# Altium footprint library IntLib.PcbLib: 221 footprints (part 5 of 14)
Each footprint in its own frame and in the unit in brackets; x right, y up, seen from the top. Pads: shape width x height; smd on the part's side, far side on the other; paste and mask are expansions set on the pad; w line width, h text height; cw(c..) or ccw(c..) is an arc to the next point about the centre after c.
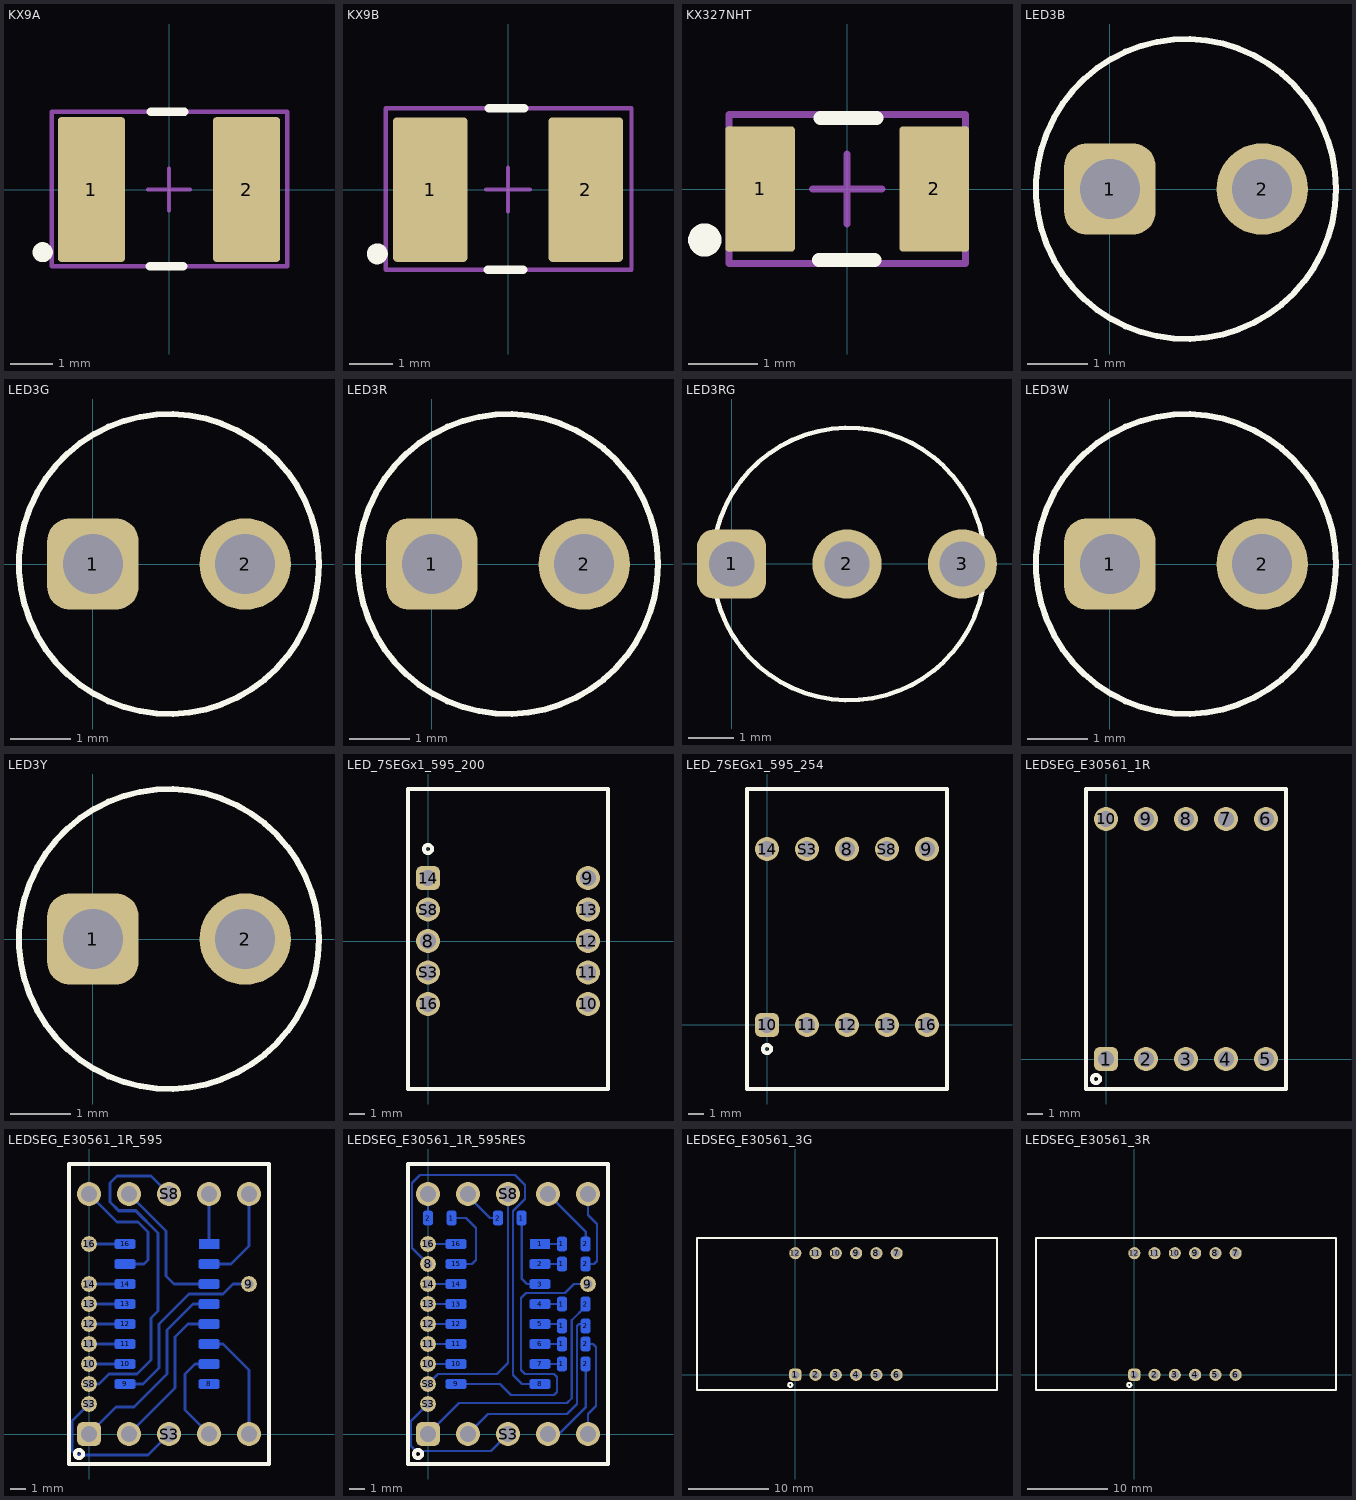
[diagram p4: the footprints below, top view; thin cyan lines are the x and y axes]

## KX9A [mm] "KX Quartz"
height 1.5
pads (2):
  rrect10% 1.6x3.45 smd: 1(-1.85,0) 2(1.85,0)
Top Overlay:
  circle w0.254: c-3.009,-1.493 r0.112
  lines w0.2: -0.457,-1.829 0.343,-1.829 ; -0.432,1.854 0.368,1.854
Mechanical 13:
  lines w0.1: -2.794,-1.829 2.819,-1.829 2.819,1.854 -2.794,1.854 -2.794,-1.829
Mechanical 15:
  lines w0.1: -0.5,0 0.5,0 ; 0,-0.5 0,0.5
3D body: height 1.12, standoff 0, extent -2.556,-1.61 2.454,1.6

## KX9B [mm] "KX Quartz"
height 1.5
pads (2):
  rrect10% 1.7x3.3 smd: 1(-1.775,0) 2(1.775,0)
Top Overlay:
  circle w0.254: c-2.984,-1.468 r0.112
  lines w0.2: -0.457,-1.829 0.343,-1.829 ; -0.432,1.854 0.368,1.854
Mechanical 13:
  lines w0.1: -2.794,-1.829 -2.794,1.854 2.819,1.854 2.819,-1.829 -2.794,-1.829
Mechanical 15:
  lines w0.1: -0.5,0 0.5,0 ; 0,-0.5 0,0.5
3D body: height 1.12, standoff 0, extent -2.556,-1.61 2.454,1.6

## KX327NHT [mm] "KX Quartz"
height 1.5
pads (2):
  rrect10% 1x1.8 smd: 1(-1.25,0) 2(1.25,0)
Top Overlay:
  circle w0.254: c-2.044,-0.731 r0.112
  lines w0.2: -0.406,-1.016 0.394,-1.016 ; -0.381,1.016 0.419,1.016
Mechanical 13:
  lines w0.1: -1.7,-1.067 1.7,-1.067 1.7,1.067 -1.7,1.067 -1.7,-1.067
Mechanical 15:
  lines w0.1: -0.5,0 0.5,0 ; 0,-0.5 0,0.5
3D body: height 0.71, standoff 0, extent -1.6,-0.686 1.6,0.814

## LED3B [mil]
pads (2):
  rrect50% 60x60 hole 39.37: 1(0,0)
  round 60 hole 39.37: 2(100,0)
Top Overlay:
  circle w3.94: c50,0 r98.43
3D body: height 235.24, standoff -59.06, extent -14.51,-65.9 112,63.9

## LED3G [mil]
pads (2):
  rrect50% 60x60 hole 39.37: 1(0,0)
  round 60 hole 39.37: 2(100,0)
Top Overlay:
  circle w3.94: c50,0 r98.43
3D body: height 244.09, standoff -78.74, extent -26.16,-78.46 111,78.46

## LED3R [mil]
pads (2):
  rrect50% 60x60 hole 39.37: 1(0,0)
  round 60 hole 39.37: 2(100,0)
Top Overlay:
  circle w3.94: c50,0 r98.43
3D body: height 244.09, standoff -78.74, extent -29,-78.46 108.16,78.46

## LED3RG [mil]
pads (3):
  rrect50% 60x60 hole 39.37: 1(0,0)
  round 60 hole 39.37: 2(100,0) 3(200,0)
Top Overlay:
  circle w3.94: c101.57,0 r118.11
3D body: height 279.74, standoff -118.06, extent -16.78,-77.48 216.78,80

## LED3W [mil]
pads (2):
  rrect50% 60x60 hole 39.37: 1(0,0)
  round 60 hole 39.37: 2(100,0)
Top Overlay:
  circle w3.94: c50,0 r98.43
3D body: height 259.84, standoff -98.43, extent -25.8,-79.73 112,77.73

## LED3Y [mil]
pads (2):
  rrect50% 60x60 hole 39.37: 1(0,0)
  round 60 hole 39.37: 2(100,0)
Top Overlay:
  circle w3.94: c50,0 r98.43
3D body: height 244.09, standoff -78.74, extent -27.58,-79 109.58,77.92

## LED_7SEGx1_595_200 [mil] "LED_7SEGx1_595_200"
height 551.18
pads (10):
  round 60 hole 39.37: 8(0,0) 9(400,157.48) 10(400,-157.48) 11(400,-78.74) 12(400,0) 13(400,78.74) 16(0,-157.48) S3(0,-78.74) S8(0,78.74)
  rrect50% 60x60 hole 39.37: 14(0,157.48)
Top Overlay:
  circle w10: c0,230 r10
  lines w10: -50,-370 450,-370 450,380 -50,380 -50,-370
3D body: height 610.74, standoff 47.74, extent -48.03,-370 448.03,378.03
3D body: height 236.22, standoff -110.24, extent -38.74,-196.85 40,196.85
3D body: height 236.22, standoff -110.24, extent 361.26,-196.85 440,196.85

## LED_7SEGx1_595_254 [mil] "LED_7SEGx1_595_254"
height 551.18
pads (10):
  round 60 hole 39.37: 8(200,440) 9(400,440) 11(100,0) 12(200,0) 13(300,0) 14(0,440) 16(400,0) S3(100,440) S8(300,440)
  rrect50% 60x60 hole 39.37: 10(0,0)
Top Overlay:
  circle w10: c0,-60 r10
  lines w10: -50,-160 -50,590 450,590 450,-160 -50,-160
3D body: height 345.28, standoff -109.06, extent -50,-50 450,50
3D body: height 345.28, standoff -109.06, extent -50,390 450,490
3D body: height 787.9, standoff 96.26, extent -59.84,-158.03 459.84,590

## LEDSEG_E30561_1R [mil] "LED 7-SEG 3-DIGIT"
height 551.18
pads (10):
  rrect50% 60x60 hole 39.37: 1(0,0)
  round 60 hole 39.37: 2(100,0) 3(200,0) 4(300,0) 5(400,0) 6(400,600) 7(300,600) 8(200,600) 9(100,600) 10(0,600)
Top Overlay:
  circle w10: c-25,-50 r10
  lines w10: -50,-75 450,-75 450,675 -50,675 -50,-75
3D body: height 314.96, standoff -248.03, extent -48.03,-75 448.03,673.03

## LEDSEG_E30561_1R_595 [mil] "LED 7-SEG 3-DIGIT + 595"
height 551.18
pads (35):
  rrect50% 52x24 smd far side mask+4: 8(300,125) 9(90,125) 10(90,175) 11(90,225) 12(90,275) 13(90,325) 14(90,375) 16(90,475) ""(90,425) ""(300,175) ""(300,225) ""(300,275) ""(300,375) ""(300,425) ""(300,325)
  round 39.37 hole 23.62: 9(400,375) 10(0,175) 11(0,225) 12(0,275) 13(0,325) 14(0,375) 16(0,475) S3(0,75) S8(0,125)
  round 60 hole 39.37: S3(200,0) S8(200,600) ""(0,600) ""(100,0) ""(100,600) ""(300,0) ""(300,600) ""(400,0) ""(400,600)
  rrect50% 60x60 hole 39.37: ""(0,0)
  rect 50x24 smd far side mask+4: ""(300,475)
Bottom Layer:
  lines w7.87: 0,0 67.5,67.5 112.5,67.5 195,150 195,260 260,325 300,325 ; 0,75 -42.5,32.5 -42.5,-42.5 -32.5,-52.5 147.5,-52.5 200,0 ; 0,125 25,125 50,150 120,150 155,185 155,290 172.5,307.5 172.5,502.5 116.81,558.19 74.31,558.19 52.5,580 52.5,627.5 70,645 155,645 200,600 ; 0,175 90,175 ; 0,225 90,225 ; 0,275 90,275 ; 0,325 90,325 ; 0,375 90,375 ; 0,475 90,475 ; 0,600 70,530 122.5,530 147.5,505 147.5,435 137.5,425 90,425 ; 90,125 135,125 175,165 175,275 250,350 335,350 360,375 400,375 ; 100,0 215,115 215,242.5 247.5,275 300,275 ; 100,600 192.5,507.5 192.5,395 212.5,375 300,375 ; 300,0 240,60 240,150 265,175 300,175 ; 300,225 335,225 400,160 400,0 ; 300,425 355,425 400,470 400,600 ; 300,475 300,600 ; 300,600 300,600
Top Overlay:
  circle w10: c-25,-50 r10
  lines w10: -50,-75 450,-75 450,675 -50,675 -50,-75
Bottom Overlay:
  lines w8: 125,105 125,495 245,495 265,475 265,105 125,105
3D body: height 314.96, standoff -248.03, extent -48.03,-75 448.03,673.03
3D body: height 67, standoff 0, extent 73,105 317,495

## LEDSEG_E30561_1R_595RES [mil] "LED 7-SEG 3-DIGIT + 595 + RES"
height 551.18
pads (52):
  rrect50% 23.62x35.43 smd far side: 1(59.06,540) 1(234.06,540) 1(335,175) 1(335,225) 1(335,270) 1(335,325) 1(335,425) 1(335,475) 2(0,540) 2(175,540) 2(394.06,175) 2(394.06,225) 2(394.06,270) 2(394.06,325) 2(394.06,425) 2(394.06,475)
  rect 50x24 smd far side mask+4: 1(280,475)
  rrect50% 52x24 smd far side mask+4: 2(280,425) 3(280,375) 4(280,325) 5(280,275) 6(280,225) 7(280,175) 8(280,125) 9(70,125) 10(70,175) 11(70,225) 12(70,275) 13(70,325) 14(70,375) 15(70,425) 16(70,475)
  round 39.37 hole 23.62: 8(0,425) 9(400,375) 10(0,175) 11(0,225) 12(0,275) 13(0,325) 14(0,375) 16(0,475) S3(0,75) S8(0,125)
  round 60 hole 39.37: S3(200,0) S8(200,600) ""(0,600) ""(100,0) ""(100,600) ""(300,0) ""(300,600) ""(400,0) ""(400,600)
  rrect50% 60x60 hole 39.37: ""(0,0)
Bottom Layer:
  lines w5.91: 0,0 77.5,77.5 347.5,77.5 359.15,89.15 359.15,284.15 394.06,319.06 394.06,325 ; 0,75 -42.5,32.5 -42.5,-30 -30,-42.5 157.5,-42.5 200,0 ; 0,125 25,150 172.5,150 200,177.5 200,600 ; 0,175 70,175 ; 0,225 70,225 ; 0,275 70,275 ; 0,325 70,325 ; 0,375 70,375 ; 0,425 -40,465 -40,627.5 -20,647.5 217.5,647.5 242.5,622.5 242.5,587.5 212.5,557.5 212.5,147.5 235,125 280,125 ; 0,475 70,475 ; 0,540 0,600 ; 59.06,540 95,540 120,515 120,435 110,425 70,425 ; 70,125 180,125 207.5,97.5 315,97.5 322.5,105 322.5,142.5 315,150 242.5,150 232.5,160 232.5,340 245,352.5 342.5,352.5 365,375 400,375 ; 100,0 150,50 347.5,50 372.5,75 372.5,270 377.5,275 394.06,275 ; 100,600 100,595 155,540 170,540 ; 229.06,540 234.06,540 234.06,388.44 247.5,375 280,375 ; 280,175 335,175 ; 280,225 335,225 ; 280,275 335,275 ; 280,325 335,325 ; 280,425 335,425 ; 280,475 335,475 ; 300,0 327.5,0 394.06,66.56 394.06,175 ; 300,600 394.06,505.94 394.06,475 ; 394.06,225 412.5,225 420,217.5 420,70 400,50 400,0 ; 394.06,425 415,425 422.5,432.5 422.5,525 400,547.5 400,600
Top Overlay:
  circle w10: c-25,-50 r10
  lines w10: -50,-75 450,-75 450,675 -50,675 -50,-75
Bottom Overlay:
  lines w3.94: -17.94,516 77.06,516 77.06,564 -17.94,564 -17.94,516 ; 157.06,516 252.06,516 252.06,564 157.06,564 157.06,516 ; 317,151 317,199 412,199 412,151 317,151 ; 317,201 317,249 412,249 412,201 317,201 ; 317,246 317,294 412,294 412,246 317,246 ; 317,301 317,349 412,349 412,301 317,301 ; 317,401 317,449 412,449 412,401 317,401 ; 317,451 317,499 412,499 412,451 317,451
  lines w8: 105,105 245,105 245,475 225,495 105,495 105,105
3D body: height 22.05, standoff 0, extent 330.54,158.5 397.46,190
3D body: height 22.05, standoff 0, extent 330.54,208.5 397.46,240
3D body: height 22.05, standoff 0, extent 330.54,253.5 397.46,285
3D body: height 22.05, standoff 0, extent 330.54,308.5 397.46,340
3D body: height 22.05, standoff 0, extent 171.59,525 238.52,556.5
3D body: height 22.05, standoff 0, extent 330.54,408.5 397.46,440
3D body: height 22.05, standoff 0, extent 330.54,458.5 397.46,490
3D body: height 22.05, standoff 0, extent -3.41,525 63.52,556.5
3D body: height 67, standoff 0, extent 53,105 297,495
3D body: height 314.96, standoff -248.03, extent -48.03,-75 448.03,673.03

## LEDSEG_E30561_3G [mil] "LED 7-SEG 3-DIGIT"
height 551.18
pads (12):
  rrect50% 60x60 hole 39.37: 1(0,0)
  round 60 hole 39.37: 2(100,0) 3(200,0) 4(300,0) 5(400,0) 6(500,0) 7(500,600) 8(400,600) 9(300,600) 10(200,600) 11(100,600) 12(0,600)
Top Overlay:
  circle w10: c-25,-50 r10
  lines w10: -485,-75 -485,675 995,675 995,-75 -485,-75
3D body: height 318.9, standoff -216.54, extent -490.16,-75 990.16,673.03

## LEDSEG_E30561_3R [mil] "LED 7-SEG 3-DIGIT"
height 551.18
pads (12):
  rrect50% 60x60 hole 39.37: 1(0,0)
  round 60 hole 39.37: 2(100,0) 3(200,0) 4(300,0) 5(400,0) 6(500,0) 7(500,600) 8(400,600) 9(300,600) 10(200,600) 11(100,600) 12(0,600)
Top Overlay:
  circle w10: c-25,-50 r10
  lines w10: -485,-75 995,-75 995,675 -485,675 -485,-75
3D body: height 318.9, standoff -216.54, extent -485.16,-75 995.16,673.03